# Altium footprint library Connektor.PcbLib: 305 footprints (part 20 of 20)
Each footprint in its own frame and in the unit in brackets; x right, y up, seen from the top. Pads: shape width x height; smd on the part's side, far side on the other; paste and mask are expansions set on the pad; w line width, h text height; cw(c..) or ccw(c..) is an arc to the next point about the centre after c.
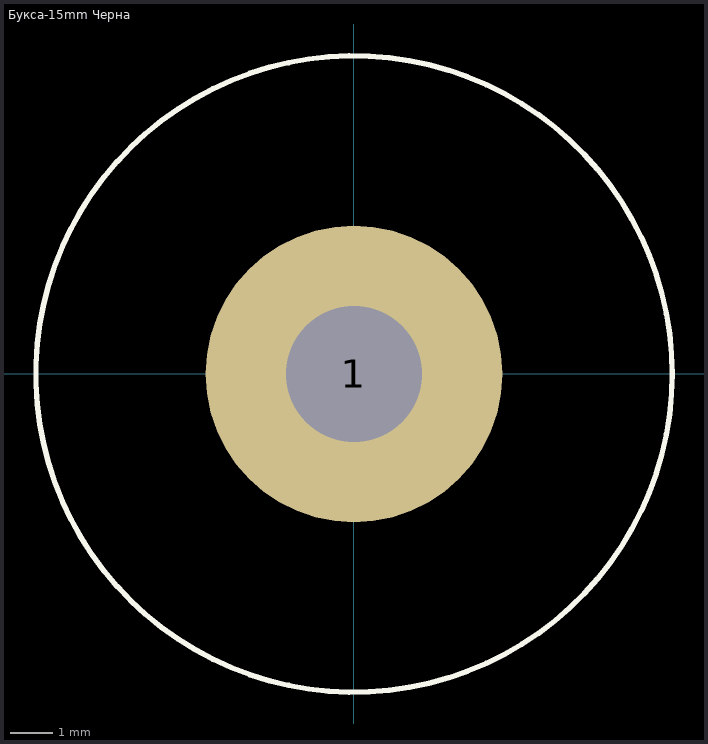
[diagram p19: the footprint, top view; thin cyan lines are the x and y axes]

## Букса-15mm Черна [mm]
pads (1):
  round 7 hole 3.2: 1(0,0)
TopOverlay:
  circle w0.127: c0,0 r7.504
3D body: height 27.7, standoff 4.5, extent -4,-4 4,4
3D body: height 28.5, standoff 15.5, extent -7.5,-7.5 7.5,7.5